# Altium integrated library Mylib Rev 4.IntLib: 207 symbols (part 3 of 3)
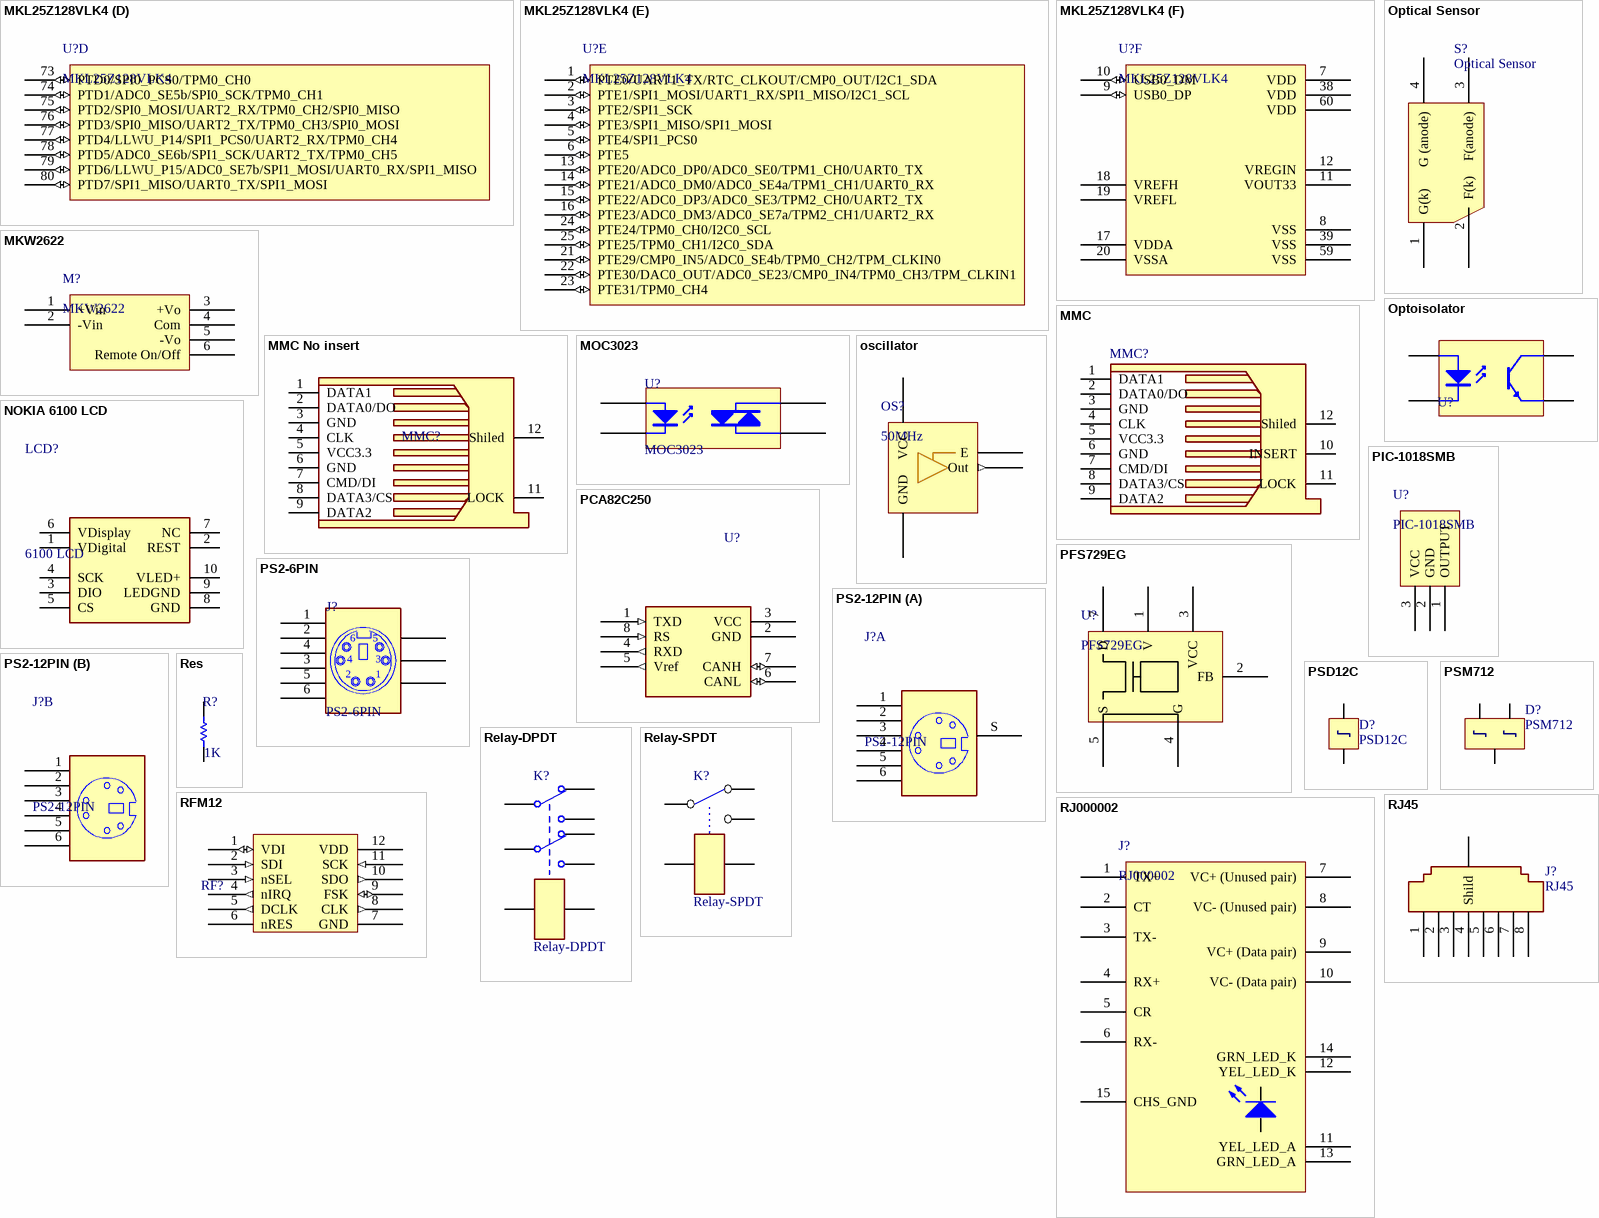
[diagram p19: symbols MKL25Z128VLK4 to RJ45]

## PS2-12PIN
designator J?
12 Pin Through Hole PS2 Socket; ASiD Part Number: PS2-12PIN-AS
footprint My_PS2_2
part A pins: 1, 2, 3, 4, 5, 6, S
part B pins: 7 1, 8 2, 9 3, 10 4, 11 5, 12 6

## PSD12C
designator D?
STANDARD CAPACITANCE TVS ARRAY; ASiD Part Number: PSD12C-AS
footprint MY_0805
pins: 1, 2

## PSM712
designator D?
600 WATT TVS ARRAY - ASYMMETRICAL DATA LINE PROTECTOR; ASiD Part Number: PSM712-AS
footprint MY_SOT23_W (SOT23, 3-Leads, Body 3.0x2.6mm (max), Pitch 0.95mm, IPC Medium Density)
pins: 1, 2, 3

## Relay-DPDT
designator K?
Dual-Pole Dual-Throw Relay; ASiD Part Number: Relay-DPDT-AS
footprint My_REL_SMALL
footprint MY_F4052
pins: 1, 2, O1, O2, P1, P2, S1, S2

## Relay-SPDT
designator K?
Standard single contact relay; ASiD Part Number: Relay-SPDT-AS
footprint My_rel
footprint MY_Songle
footprint MY_34.51.7
pins: 1, 2, 3, 4, 5

## Res
designator R?, comment 1K
Standard resistor; ASiD Part Number: Res-AS; Value: 1K
footprint MY_1206
footprint MY_0805
footprint MY_1210
footprint MY_1310
footprint MY_1608
footprint MY_1812
footprint MY_1825
footprint MY_2012
footprint MY_2220
footprint MY_2225
footprint MY_3216
footprint MY_3225
footprint MY_4532
footprint MY_4564
footprint MY_0201
footprint MY_0402
footprint MY_0603
footprint MY_(0.25w)_0207V
footprint MY_(0.25w)_0207_10
footprint MY_0309V
footprint MY_0309_12
footprint MY_0414V
footprint MY_0414_15
footprint MY_(0.5w)_0411V
footprint MY_(0.5w)_0411_15
footprint MY_(1w)_0613V
footprint MY_(1w)_0613_15
footprint MY_(2w)_0617V
footprint MY_(2w)_0617_22
footprint MY_(3w)_0817V
footprint MY_(3w)_0817_22
footprint MY_(5w)_0922V
footprint MY_(5w)_0922_22
footprint MY_2010
footprint MY_1218
footprint MY_2512 (R2512)
pins: 1, 2

## RFM12
designator RF?  (value not drawn)
Universal ISM Band FSK Transceiver Module; ASiD Part Number: RFM12-AS
footprint My_RFM12
pins: 1 VDI (io), 2 SDI (in), 3 nSEL (in), 4 nIRQ (out), 5 DCLK (out), 6 nRES, 7 GND (power), 8 CLK (out), 9 FSK (io), 10 SDO (out), 11 SCK (in), 12 VDD (power)

## RJ000002
designator J?
LAN 10/100BASE T Power over Ethernet RJ45 Jack; ASiD Part Number: RJ000002-AS
footprint MY_RJ000002 (Connector; PCB Jack, Thru-Hole; 1-Port, 8 Positions, 10 Loaded; Shielded without Lightpipes; Right Angle)
pins: 1 TX+, 2 CT, 3 TX-, 4 RX+, 5 CR, 6 RX-, 7 VC+ (Unused pair), 8 VC- (Unused pair), 9 VC+ (Data pair), 10 VC- (Data pair), 11 YEL_LED_A, 12 YEL_LED_K, 13 GRN_LED_A, 14 GRN_LED_K, 15 CHS_GND

## RJ45
designator J?
Right Angle, Standard Profile, RJ45-Keyed, Flange Mount PCB Jack; ASiD Part Number: RJ45-AS
footprint My_RJ45
footprint MY_P02_B02_P7C9
pins: 1, 2, 3, 4, 5, 6, 7, 8, shild Shild

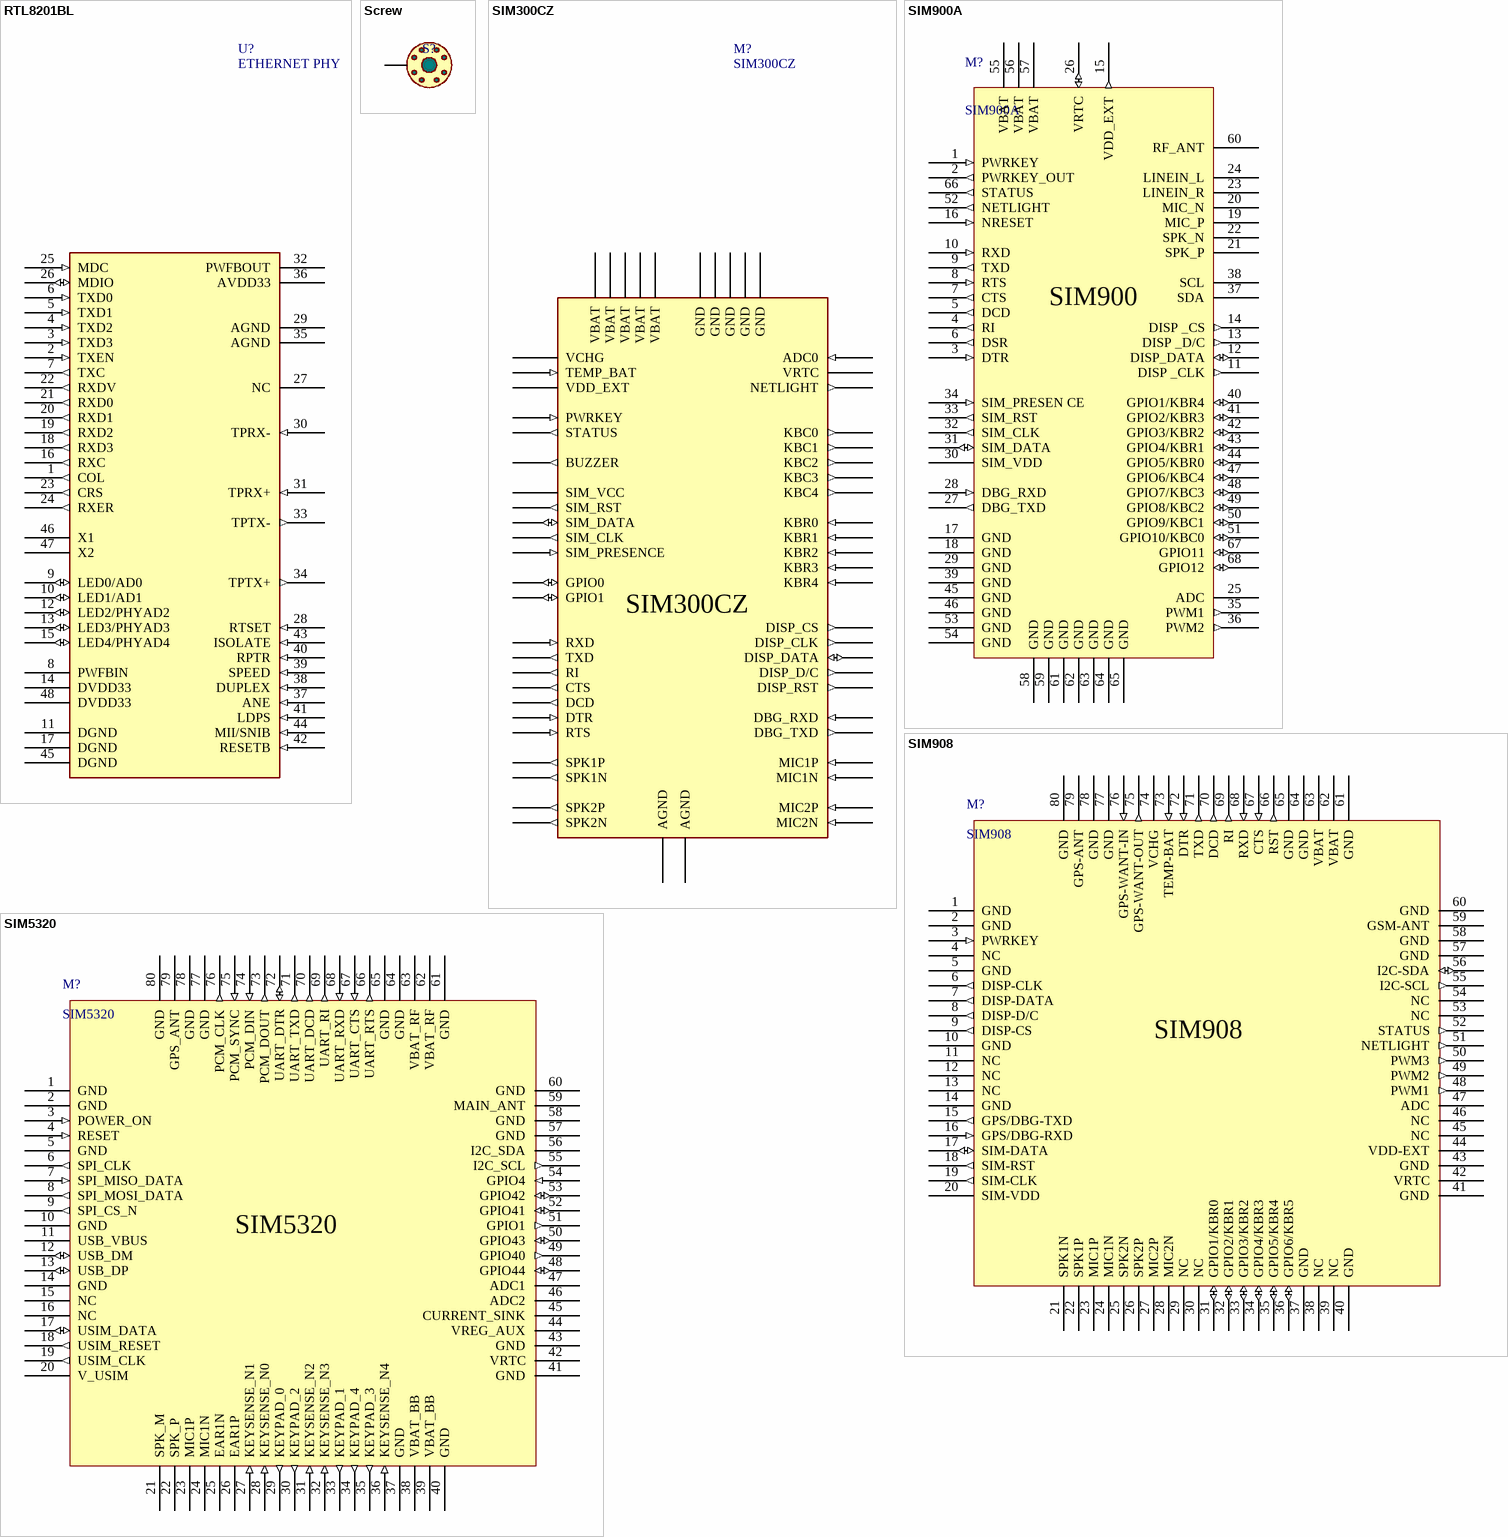
[diagram p14: symbols RTL8201BL to SIM5320]

## RTL8201BL
designator U?, comment ETHERNET PHY
SINGLE PORT 10/100M  FAST ETHERNET PHYCEIVER; ASiD Part Number: RTL8201BL-AS
footprint MY_LQFP48 (TSQFP, 48-Leads, Body 9.0x9.0mm (max), Pitch 0.50mm, IPC Medium Density)
pins: 1 COL (out), 2 TXEN (in), 3 TXD3 (in), 4 TXD2 (in), 5 TXD1 (in), 6 TXD0 (in), 7 TXC (out), 8 PWFBIN (power), 9 LED0/AD0 (io), 10 LED1/AD1 (io), 11 DGND (power), 12 LED2/PHYAD2 (io), 13 LED3/PHYAD3 (io), 14 DVDD33 (power), 15 LED4/PHYAD4 (io), 16 RXC (out), 17 DGND (power), 18 RXD3 (out), 19 RXD2 (out), 20 RXD1 (out), 21 RXD0 (out), 22 RXDV (out), 23 CRS (out), 24 RXER (out), 25 MDC (in), 26 MDIO (io), 27 NC, 28 RTSET (in), 29 AGND (power), 30 TPRX- (in), 31 TPRX+ (in), 32 PWFBOUT (power), 33 TPTX- (out), 34 TPTX+ (out), 35 AGND (power), 36 AVDD33 (power), 37 ANE (in), 38 DUPLEX (in), 39 SPEED (in), 40 RPTR (in), 41 LDPS (in), 42 RESETB (in), 43 ISOLATE (in), 44 MII/SNIB (in), 45 DGND (power), 46 X1, 47 X2, 48 DVDD33 (power)

## Screw
designator S?  (value not drawn)  (net tie, no BOM)
3mm Screw; ASiD Part Number: Screw-AS
footprint MY_PAD_3MM
pins: 0

## SIM300CZ
designator M?
GSM/GPRS Module; ASiD Part Number: SIM300CZ-AS
footprint MY_SIM300
pins: 1 VBAT (power), 2 GND (power), 3 VBAT (power), 4 GND (power), 5 VBAT (power), 6 GND (power), 7 VBAT (power), 8 GND (power), 9 VBAT (power), 10 GND (power), 11 VCHG (power), 12 ADC0 (in), 13 TEMP_BAT (in), 14 VRTC, 15 VDD_EXT, 16 NETLIGHT (out), 17 PWRKEY (in), 18 KBC0 (out), 19 STATUS (out), 20 KBC1 (out), 21 GPIO0 (io), 22 KBC2 (out), 23 BUZZER (out), 24 KBC3 (out), 25 SIM_VCC (power), 26 KBC4 (out), 27 SIM_RST (out), 28 KBR0 (in), 29 SIM_DATA (io), 30 KBR1 (in), 31 SIM_CLK (out), 32 KBR2 (in), 33 SIM_PRESENCE (in), 34 KBR3 (in), 35 GPIO1 (io), 36 KBR4 (in), 37 DCD (out), 38 DISP_CS (out), 39 DTR (in), 40 DISP_CLK (out), 41 RXD (in), 42 DISP_DATA (io), 43 TXD (out), 44 DISP_D/C (out), 45 RTS (in), 46 DISP_RST (out), 47 CTS (out), 48 DBG_RXD (in), 49 RI (out), 50 DBG_TXD (out), 51 AGND (power), 52 AGND (power), 53 SPK1P (out), 54 MIC1P (in), 55 SPK1N (out), 56 MIC1N (in), 57 SPK2P (out), 58 MIC2P (in), 59 SPK2N (out), 60 MIC2N (in)

## SIM900A
designator M?
GSM/GPRS Module; ASiD Part Number: SIM900A-AS
footprint my_sim900
pins: 1 PWRKEY (in), 2 PWRKEY_OUT (out), 3 DTR (in), 4 RI (out), 5 DCD (out), 6 DSR (out), 7 CTS (out), 8 RTS (in), 9 TXD (out), 10 RXD (in), 11 DISP _CLK (out), 12 DISP_DATA (io), 13 DISP _D/C (out), 14 DISP _CS (out), 15 VDD_EXT (out), 16 NRESET (in), 17 GND (power), 18 GND (power), 19 MIC_P, 20 MIC_N, 21 SPK_P, 22 SPK_N, 23 LINEIN_R, 24 LINEIN_L, 25 ADC, 26 VRTC (io), 27 DBG_TXD (out), 28 DBG_RXD (in), 29 GND (power), 30 SIM_VDD, 31 SIM_DATA (io), 32 SIM_CLK (out), 33 SIM_RST (out), 34 SIM_PRESEN CE (in), 35 PWM1 (out), 36 PWM2 (out), 37 SDA (oc), 38 SCL (oc), 39 GND (power), 40 GPIO1/KBR4 (io), 41 GPIO2/KBR3 (io), 42 GPIO3/KBR2 (io), 43 GPIO4/KBR1 (io), 44 GPIO5/KBR0 (io), 45 GND (power), 46 GND (power), 47 GPIO6/KBC4 (io), 48 GPIO7/KBC3 (io), 49 GPIO8/KBC2 (io), 50 GPIO9/KBC1 (io), 51 GPIO10/KBC0 (io), 52 NETLIGHT (out), 53 GND (power), 54 GND (power), 55 VBAT (power), 56 VBAT (power), 57 VBAT (power), 58 GND (power), 59 GND (power), 60 RF_ANT, 61 GND (power), 62 GND (power), 63 GND (power), 64 GND (power), 65 GND (power), 66 STATUS (out), 67 GPIO11 (io), 68 GPIO12 (io)
text: SIM900

## SIM908
designator M?
GSM/GPRS/GPS Module
footprint MY_Sim908
pins: 1 GND (power), 2 GND (power), 3 PWRKEY (in), 4 NC, 5 GND (power), 6 DISP-CLK (out), 7 DISP-DATA (out), 8 DISP-D/C (out), 9 DISP-CS (out), 10 GND (power), 11 NC, 12 NC, 13 NC, 14 GND (power), 15 GPS/DBG-TXD (out), 16 GPS/DBG-RXD (in), 17 SIM-DATA (io), 18 SIM-RST (out), 19 SIM-CLK (out), 20 SIM-VDD (power), 21 SPK1N, 22 SPK1P, 23 MIC1P, 24 MIC1N, 25 SPK2N, 26 SPK2P, 27 MIC2P, 28 MIC2N, 29 NC, 30 NC, 31 GPIO1/KBR0 (io), 32 GPIO2/KBR1 (io), 33 GPIO3/KBR2 (io), 34 GPIO4/KBR3 (io), 35 GPIO5/KBR4 (io), 36 GPIO6/KBR5 (io), 37 GND (power), 38 NC, 39 NC, 40 GND, 41 GND (power), 42 VRTC (power), 43 GND (power), 44 VDD-EXT (power), 45 NC, 46 NC, 47 ADC, 48 PWM1 (out), 49 PWM2 (out), 50 PWM3 (out), 51 NETLIGHT (out), 52 STATUS (out), 53 NC, 54 NC, 55 I2C-SCL (out), 56 I2C-SDA (io), 57 GND (power), 58 GND (power), 59 GSM-ANT, 60 GND (power), 61 GND (power), 62 VBAT (power), 63 VBAT (power), 64 GND (power), 65 GND (power), 66 RST (out), 67 CTS (in), 68 RXD (in), 69 RI (out), 70 DCD (out), 71 TXD (out), 72 DTR (in), 73 TEMP-BAT (in), 74 VCHG, 75 GPS-WANT-OUT (out), 76 GPS-WANT-IN (in), 77 GND (power), 78 GND (power), 79 GPS-ANT, 80 GND (power)

## SIM5320
designator M?
GSM/GPRS/GPS Module
footprint MY_Sim908
pins: 1 GND (power), 2 GND (power), 3 POWER_ON (in), 4 RESET (in), 5 GND (power), 6 SPI_CLK (out), 7 SPI_MISO_DATA (in), 8 SPI_MOSI_DATA (out), 9 SPI_CS_N (out), 10 GND (power), 11 USB_VBUS, 12 USB_DM (io), 13 USB_DP (io), 14 GND (power), 15 NC, 16 NC, 17 USIM_DATA (io), 18 USIM_RESET (out), 19 USIM_CLK (out), 20 V_USIM, 21 SPK_M, 22 SPK_P, 23 MIC1P, 24 MIC1N, 25 EAR1N, 26 EAR1P, 27 KEYSENSE_N1 (in), 28 KEYSENSE_N0 (in), 29 KEYPAD_0 (out), 30 KEYPAD_2 (out), 31 KEYSENSE_N2 (in), 32 KEYSENSE_N3 (in), 33 KEYPAD_1 (out), 34 KEYPAD_4 (out), 35 KEYPAD_3 (out), 36 KEYSENSE_N4 (in), 37 GND (power), 38 VBAT_BB (power), 39 VBAT_BB (power), 40 GND (power), 41 GND (power), 42 VRTC (power), 43 GND (power), 44 VREG_AUX, 45 CURRENT_SINK, 46 ADC2, 47 ADC1, 48 GPIO44 (io), 49 GPIO40 (out), 50 GPIO43 (io), 51 GPIO1 (out), 52 GPIO41 (io), 53 GPIO42 (io), 54 GPIO4 (in), 55 I2C_SCL (out), 56 I2C_SDA (oc), 57 GND (power), 58 GND (power), 59 MAIN_ANT, 60 GND (power), 61 GND (power), 62 VBAT_RF (power), 63 VBAT_RF (power), 64 GND (power), 65 GND (power), 66 UART_RTS (out), 67 UART_CTS (in), 68 UART_RXD (in), 69 UART_RI (out), 70 UART_DCD (out), 71 UART_TXD (out), 72 UART_DTR (io), 73 PCM_DOUT (out), 74 PCM_DIN (in), 75 PCM_SYNC (in), 76 PCM_CLK (out), 77 GND (power), 78 GND (power), 79 GPS_ANT, 80 GND

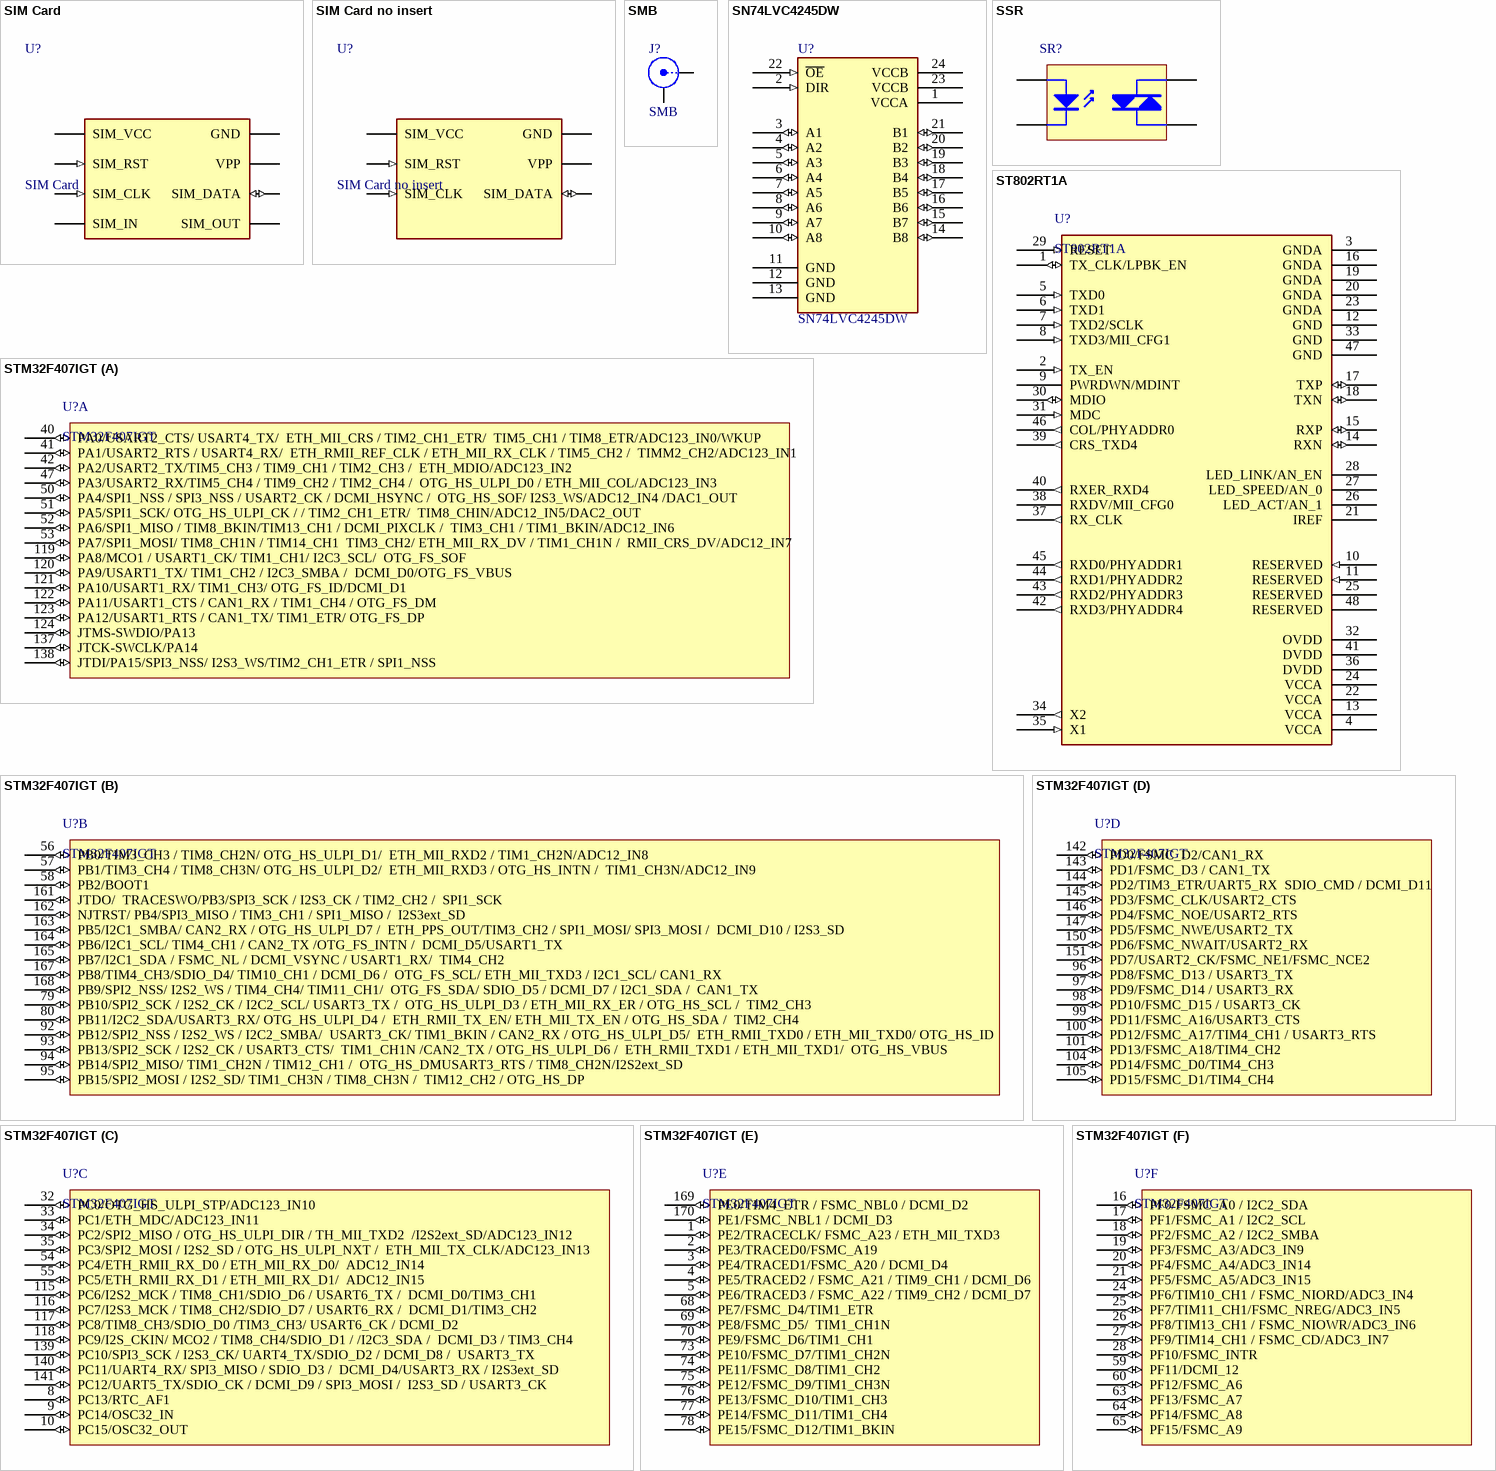
[diagram p15: symbols SIM Card to STM32F407IGT]

## SIM Card
designator U?
ASiD Part Number: SIM Card-AS
footprint MY_SIMCARD
pins: C1 SIM_VCC (power), C2 SIM_RST (in), C3 SIM_CLK (in), C4 SIM_IN, C5 GND (power), C6 VPP, C7 SIM_DATA (io), C8 SIM_OUT

## SIM Card no insert
designator U?
SIM Card; ASiD Part Number: SIM Card no insert-AS
footprint MY_C707 (C707_10M006_512_2)
pins: C1 SIM_VCC (power), C2 SIM_RST (in), C3 SIM_CLK (in), C5 GND (power), C6 VPP, C7 SIM_DATA (io)

## SMB
designator J?
SMB Connector; ASiD Part Number: SMB-AS
footprint MY_SMB-G
footprint MY_SMB-H
footprint MY_SMB-V
pins: 1 X, 2 Y

## SN74LVC4245DW
designator U?
Octal Bus Transceiver and 3.3-V to 5-V Shifter with 3-State Outputs; ASiD Part Number: SN74LVC4245DW-AS
footprint MY_SOIC24
pins: 1 VCCA (power), 2 DIR (in), 3 A1 (io), 4 A2 (io), 5 A3 (io), 6 A4 (io), 7 A5 (io), 8 A6 (io), 9 A7 (io), 10 A8 (io), 11 GND (power), 12 GND (power), 13 GND (power), 14 B8 (io), 15 B7 (io), 16 B6 (io), 17 B5 (io), 18 B4 (io), 19 B3 (io), 20 B2 (io), 21 B1 (io), 22 ~{OE} (in), 23 VCCB (power), 24 VCCB (power)

## SSR
designator SR?  (value not drawn)
footprint MY_G3MB
pins: 1 A, 2 K, 3 E, 4 C

## ST802RT1A
designator U?
10/100 real-time Ethernet 3.3 V transceiver; ASiD Part Number: ST802RT1A-AS
footprint MY_LQFP48 (TSQFP, 48-Leads, Body 9.0x9.0mm (max), Pitch 0.50mm, IPC Medium Density)
pins: 1 TX_CLK/LPBK_EN (io), 2 TX_EN (in), 3 GNDA (power), 4 VCCA (power), 5 TXD0 (in), 6 TXD1 (in), 7 TXD2/SCLK (in), 8 TXD3/MII_CFG1 (in), 9 PWRDWN/MDINT (oc), 10 RESERVED (in), 11 RESERVED (in), 12 GND (power), 13 VCCA (power), 14 RXN (io), 15 RXP (io), 16 GNDA (power), 17 TXP (io), 18 TXN (io), 19 GNDA (power), 20 GNDA (power), 21 IREF, 22 VCCA (power), 23 GNDA (power), 24 VCCA (power), 25 RESERVED, 26 LED_ACT/AN_1 (oc), 27 LED_SPEED/AN_0 (oc), 28 LED_LINK/AN_EN (oc), 29 RESET (in), 30 MDIO (io), 31 MDC (in), 32 OVDD (power), 33 GND (power), 34 X2 (out), 35 X1 (in), 36 DVDD (power), 37 RX_CLK (out), 38 RXDV/MII_CFG0 (oc), 39 CRS_TXD4 (out), 40 RXER_RXD4 (out), 41 DVDD (power), 42 RXD3/PHYADDR4 (out), 43 RXD2/PHYADDR3 (out), 44 RXD1/PHYADDR2 (out), 45 RXD0/PHYADDR1 (out), 46 COL/PHYADDR0 (out), 47 GND (power), 48 RESERVED